# Altium footprint library Miscellaneous Devices.PcbLib: 277 footprints (part 18 of 18)
Each footprint in its own frame and in the unit in brackets; x right, y up, seen from the top. Pads: shape width x height; smd on the part's side, far side on the other; paste and mask are expansions set on the pad; w line width, h text height; cw(c..) or ccw(c..) is an arc to the next point about the centre after c.
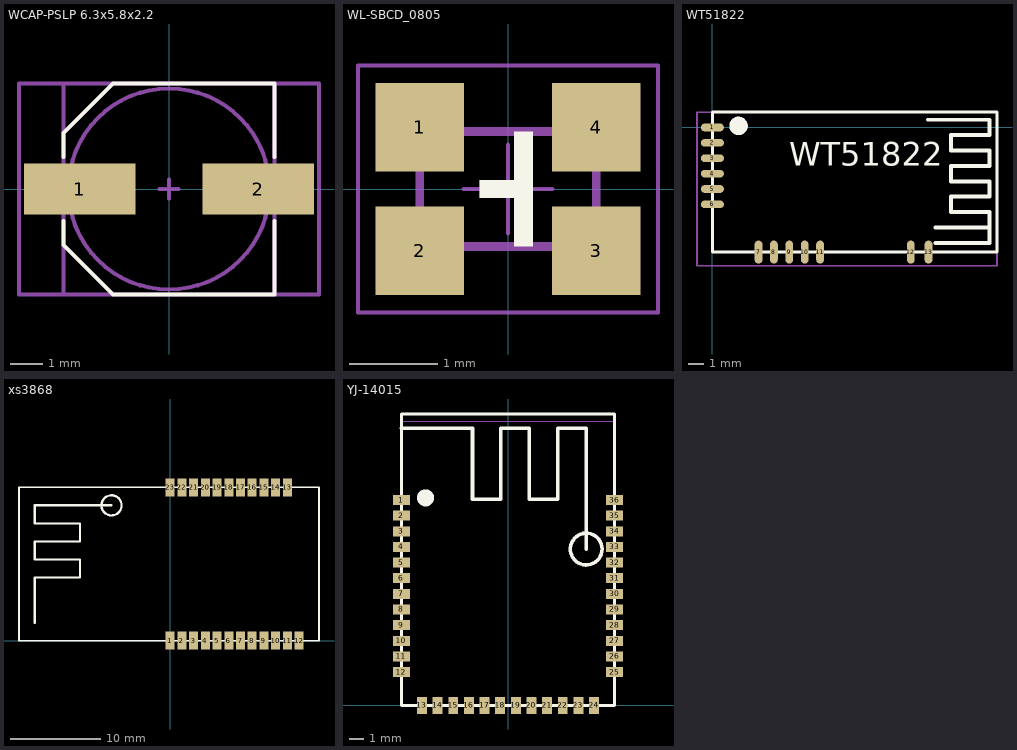
[diagram p17: the footprints below, top view; thin cyan lines are the x and y axes]

## WCAP-PSLP 6.3x5.8x2.2 [mm] "Polarized capacitors, Aluminum Polymer Capacitors, 2-Leads, Body 6.3x5.8x2.2"
height 5.8
pads (2):
  rect 3.5x1.6 smd: 1(-2.8,0) 2(2.8,0)
Top Overlay:
  lines w0.127: -3.3,-1 -3.3,-1.75 -1.75,-3.3 3.3,-3.3 3.3,-1 ; -3.3,1 -3.3,1.75 -1.75,3.3 3.3,3.3 3.3,1
Mechanical 13:
  circle w0.127: c0,0 r3.15
  lines w0.127: -3.3,-3.3 3.3,-3.3 3.3,3.3 -3.3,3.3 -3.3,-3.3
Mechanical 15:
  lines w0.127: -0.3,0 0.3,0 ; 0,-0.3 0,0.3 ; -4.699,-3.302 4.699,-3.302 4.699,3.302 -4.699,3.302 -4.699,-3.302
3D body "6.3x5.8x2.2.stp": height 5.75, standoff -0.05, extent -3.65,-3.3 3.65,3.3

## WL-SBCD_0805 [mm] "SMT Bi-color Chip LED Diffuesed, body 2x1.3mm"
height 0.5
pads (4):
  rect 1x1 smd: 1(-1,0.7) 2(-1,-0.7) 3(1,-0.7) 4(1,0.7)
Top Overlay:
  region: 0.28,0.65 0.28,-0.65 0.07,-0.65 0.07,-0.1 -0.32,-0.1 -0.32,0.1 0.07,0.1 0.07,0.65
Mechanical 13:
  region: 0.28,0.65 0.28,-0.65 0.07,-0.65 0.07,-0.1 -0.32,-0.1 -0.32,0.1 0.07,0.1 0.07,0.65
  lines w0.1: -1,-0.65 -1,0.65 1,0.65 1,-0.65 -1,-0.65
Mechanical 15:
  lines w0.05: -0.5,0 0.5,0 ; 0,-0.5 0,0.5 ; -1.7,-1.4 -1.7,1.4 1.7,1.4 1.7,-1.4 -1.7,-1.4
3D body "150080xx54050.stp": height 0.5, standoff 0, extent -1,-0.65 1,0.65

## WT51822 [mm]
height 2
pads (13):
  oval 1.5x0.5 smd: 1(0,0) 2(0,-1) 3(0,-2) 4(0,-3) 5(0,-4) 6(0,-5)
  oval 0.5x1.5 smd: 7(3,-8.1) 8(4,-8.1) 9(5,-8.1) 10(6,-8.1) 11(7,-8.1) 12(12.9,-8.1) 13(14.05,-8.1)
Top Overlay:
  circle w0.6: c1.7,0.1 r0.3
  lines w0.2: 0,-8.1 18.5,-8.1 18.5,1 0,1 0,-8.1
  lines w0.254: 14,0.5 18,0.5 18,-0.5 15.5,-0.5 15.5,-1.5 18,-1.5 18,-2.5 15.5,-2.5 15.5,-3.5 18,-3.5 18,-4.5 15.5,-4.5 15.5,-5.5 18,-5.5 18,-6.5 ; 14.5,-7.5 18,-7.5 18,-6.5 ; 14.5,-6.5 18,-6.5
  text "WT51822" at 5,-2.5 h1.52
Mechanical 13:
  lines w0.1: -1,-9 -1,1 18.5,1 18.5,-9 -1,-9
Mechanical 15:
  lines w0.1: -0.5,0 0.5,0 ; 0,-0.5 0,0.5

## xs3868 [mm] "Bluetoth module"
height 5.06
pads (23):
  rect 1x2 smd: 1(0,0) 3(2.6,0) 4(3.9,0) 5(5.2,0) 6(6.5,0) 7(7.8,0) 8(9.1,0) 9(10.4,0) 11(13,0) 12(14.3,0) 13(13,17) 14(11.7,17) 16(9.1,17) 17(7.8,17) 18(6.5,17) 19(5.2,17) 20(3.9,17) 21(2.6,17) 22(1.3,17)
  rect 1x2 smd paste+0: 2(1.3,0) 10(11.7,0) 15(10.4,17) 23(0,17)
Top Overlay:
  circle w0.254: c-6.5,15 r1.118
  lines w0.2: -16.75,0 16.5,0 16.5,17 -16.75,17 -16.75,0
  lines w0.254: -15,2 -15,7 -10,7 -10,9 -15,9 -15,11 -10,11 -10,13 -15,13 -15,15 -6.5,15

## YJ-14015 [mm]
pads (36):
  rect 1.2x0.7 smd: 1(-7.5,14.45) 2(-7.5,13.35) 3(-7.5,12.25) 4(-7.5,11.15) 5(-7.5,10.05) 6(-7.5,8.95) 7(-7.5,7.85) 8(-7.5,6.75) 9(-7.5,5.65) 10(-7.5,4.55) 11(-7.5,3.45) 12(-7.5,2.35) 25(7.5,2.35) 26(7.5,3.45) 27(7.5,4.55) 28(7.5,5.65) 29(7.5,6.75) 30(7.5,7.85) 31(7.5,8.95) 32(7.5,10.05) 33(7.5,11.15) 34(7.5,12.25) 35(7.5,13.35) 36(7.5,14.45)
  rect 0.7x1.2 smd: 13(-6.05,0) 14(-4.95,0) 15(-3.85,0) 16(-2.75,0) 17(-1.65,0) 18(-0.55,0) 19(0.55,0) 20(1.65,0) 21(2.75,0) 22(3.85,0) 23(4.95,0) 24(6.05,0)
Top Overlay:
  circle w0.254: c5.5,11 r1.118
  circle w0.6: c-5.8,14.6 r0.3
  lines w0.2: -7.5,0 -7.5,20.5 7.5,20.5 7.5,0 -7.5,0
  lines w0.254: -7.5,19.5 -2.5,19.5 -2.5,14.5 -0.5,14.5 -0.5,19.5 1.5,19.5 1.5,14.5 3.5,14.5 3.5,19.5 5.5,19.5 5.5,11
Mechanical 2:
  lines w0: -7.5,0 -7.5,20 7.5,20 7.5,0 -7.5,0